# Altium footprint library ICs And Semiconductors SMD.PcbLib: 943 footprints (part 21 of 60)
Each footprint in its own frame and in the unit in brackets; x right, y up, seen from the top. Pads: shape width x height; smd on the part's side, far side on the other; paste and mask are expansions set on the pad; w line width, h text height; cw(c..) or ccw(c..) is an arc to the next point about the centre after c.
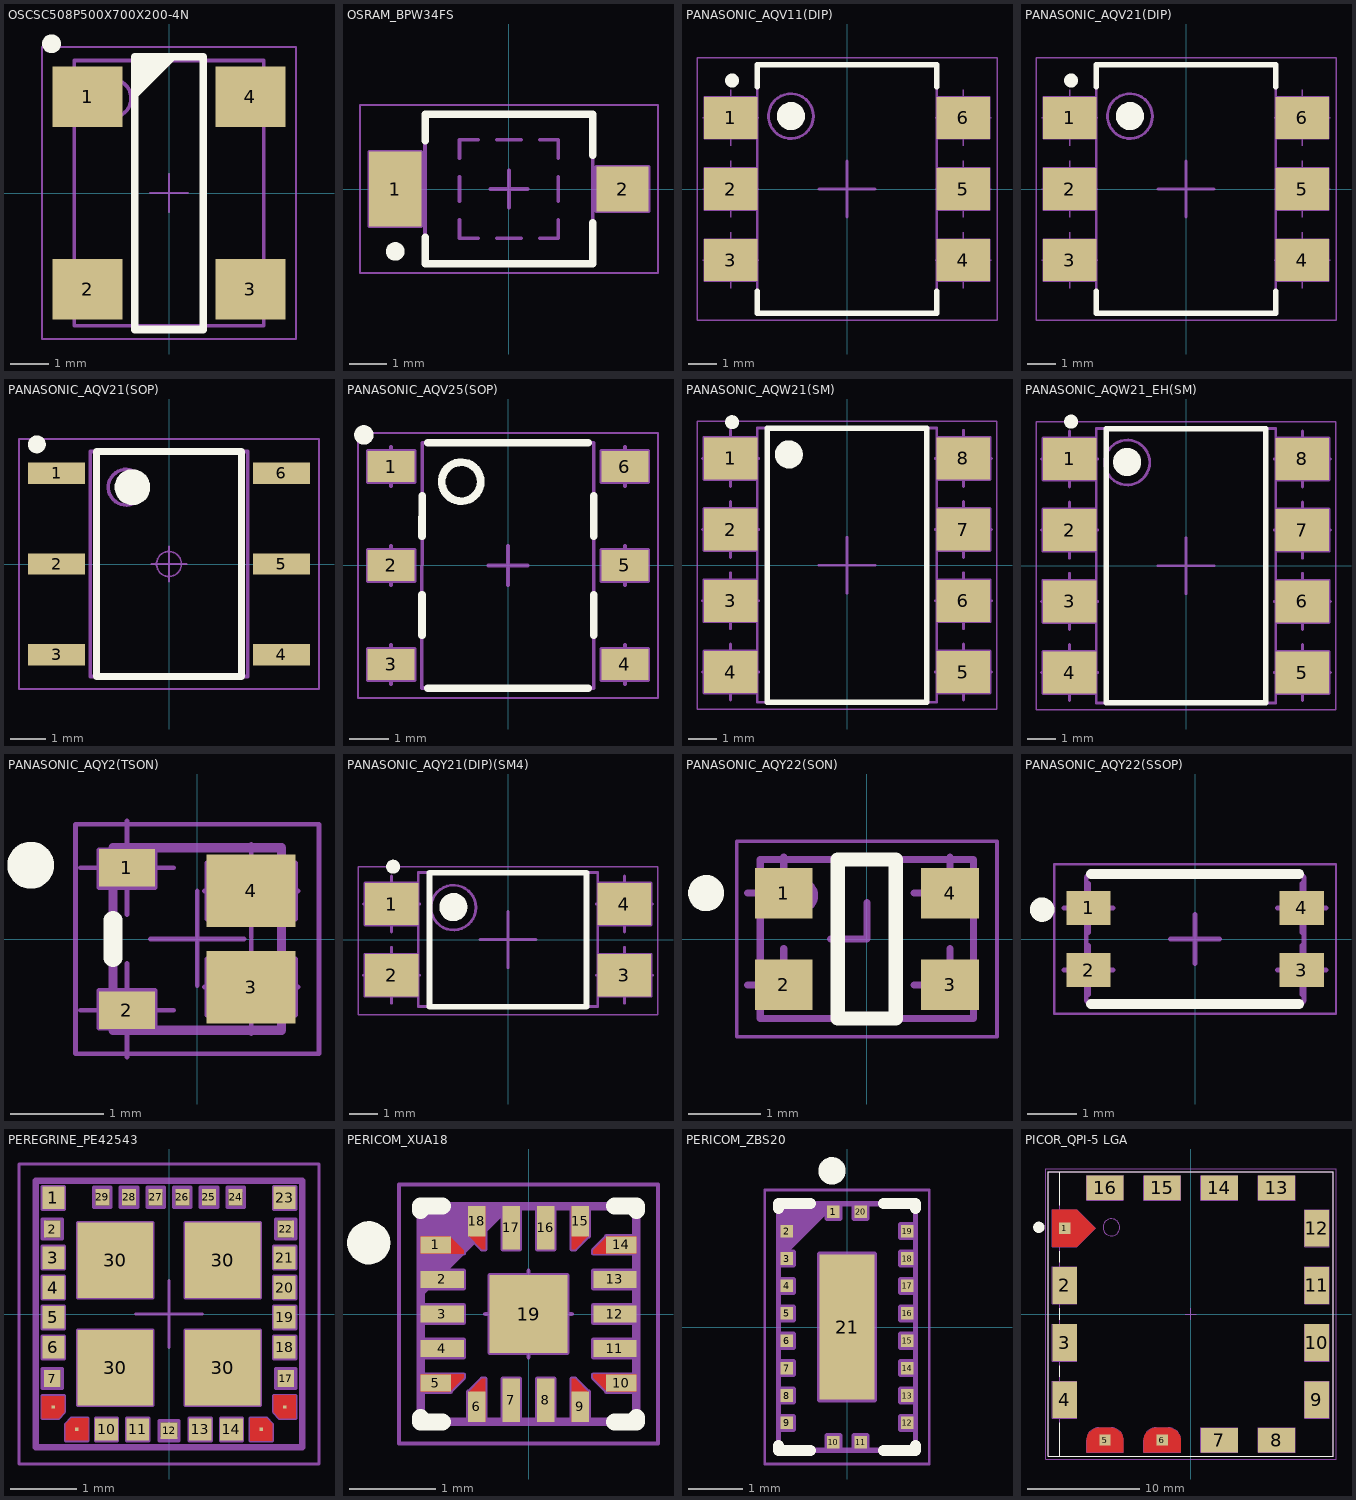
[diagram p20: the footprints below, top view; thin cyan lines are the x and y axes]

## OSCSC508P500X700X200-4N [mm] "CFPT Case, SMD Oscillator, side convave, 4 pins, 5.00x7.00mm"
height 2
pads (4):
  rect 1.85x1.6 smd: 1(-2.15,2.54) 2(-2.15,-2.54) 3(2.15,-2.54) 4(2.15,2.54)
Top Overlay:
  circle w0.25: c-3.1,3.94 r0.125
  lines w0.2: -0.9,2.6 0.1,3.6 ; -0.9,2.8 -0.1,3.6 ; -0.9,3 -0.3,3.6 ; -0.9,3.2 -0.5,3.6 ; -0.9,3.4 -0.7,3.6 ; -0.9,-3.6 -0.9,3.6 0.9,3.6 0.9,-3.6 -0.9,-3.6
Mechanical 14:
  circle w0.1: c-1.5,2.5 r0.5
  lines w0.1: -2.5,-3.5 2.5,-3.5 2.5,3.5 -2.5,3.5 -2.5,-3.5
Mechanical 15:
  lines w0.05: -0.5,0 0.5,0 ; 0,-0.5 0,0.5 ; -3.35,-3.85 3.35,-3.85 3.35,3.85 -3.35,3.85 -3.35,-3.85
3D body "OSCSC508P500X700X200-4N.stp": height 2, standoff 0, extent -2.6,-3.6 2.6,3.6

## OSRAM_BPW34FS [mm] "SMT Silicon PIN Photodiode, Photosensitive Area 2.65 x 2.65 mm, with Daylight Filter"
height 1.2
pads (2):
  rect 1.4x2 smd: 1(-3.05,0)
  rect 1.4x1.2 smd: 2(3.05,0)
Top Overlay:
  circle w0.25: c-3.05,-1.675 r0.125
  lines w0.2: -2.25,-1.3 -2.25,-2 2.25,-2 2.25,-0.9 ; -2.25,1.3 -2.25,2 2.25,2 2.25,0.9
Mechanical 8:
  lines w0.1: -3.55,0 -3.05,0 ; -3.05,-0.5 -3.05,0 ; -3.05,0.5 -3.05,0 ; -2.55,0 -3.05,0 ; -0.5,0 0,0 ; 0,-0.5 0,0 ; 0,0.5 0,0 ; 0.5,0 0,0 ; 2.55,0 3.05,0 ; 3.05,-0.5 3.05,0 ; 3.05,0.5 3.05,0 ; 3.55,0 3.05,0 ; -3.75,-1 -2.35,-1 -2.35,1 -3.75,1 -3.75,-1 ; 2.35,-0.6 3.75,-0.6 3.75,0.6 2.35,0.6 2.35,-0.6
Mechanical 14:
  lines w0.1: -2.25,-0.85 -3.35,-0.85 -3.35,0.85 -2.25,0.85 ; -2.25,-0.45 -2.656,-0.45 -2.656,0.45 -2.25,0.45 ; -1.325,-0.825 -1.325,-1.325 -0.825,-1.325 ; -1.325,-0.325 -1.325,0.325 ; -1.325,0.825 -1.325,1.325 -0.825,1.325 ; -0.325,-1.325 0.325,-1.325 ; -0.325,1.325 0.325,1.325 ; 0.825,-1.325 1.325,-1.325 1.325,-0.825 ; 0.825,1.325 1.325,1.325 1.325,0.825 ; 1.325,-0.325 1.325,0.325 ; 2.25,-0.45 3.35,-0.45 3.35,0.45 2.25,0.45 ; -2.25,-2 -2.25,2 2.25,2 2.25,-2 -2.25,-2
Mechanical 15:
  lines w0.05: -4,-2.25 -4,2.25 4,2.25 4,-2.25 -4,-2.25
3D body "OSRAM_BPW34FS.stp": height 1.2, standoff 0, extent -3.35,-2 3.35,2

## PANASONIC_AQV11(DIP) [mm] "PANASONIC_AQV11(DIP) 2.54mm pitch; 6 pin, 6.45mm W X 8.85mm L X 3.40mm H body"
height 3.4
pads (6):
  rect 1.9x1.5 smd: 1(-4.15,2.54) 2(-4.15,0) 3(-4.15,-2.54) 4(4.15,-2.54) 5(4.15,0) 6(4.15,2.54)
Top Overlay:
  circle w0.5: c-2,2.6 r0.25
  circle w0.25: c-4.1,3.87 r0.125
  lines w0.2: -3.2,-3.64 -3.2,-4.425 3.2,-4.425 3.2,-3.64 ; -3.2,3.64 -3.2,4.425 3.2,4.425 3.2,3.64
Mechanical 8:
  lines w0.05: -5.15,-2.54 -4.15,-2.54 ; -5.15,0 -4.15,0 ; -5.15,2.54 -4.15,2.54 ; -4.15,-3.54 -4.15,-2.54 ; -4.15,-1.54 -4.15,-2.54 ; -4.15,-1 -4.15,0 ; -4.15,1 -4.15,0 ; -4.15,1.54 -4.15,2.54 ; -4.15,3.54 -4.15,2.54 ; -3.15,-2.54 -4.15,-2.54 ; -3.15,0 -4.15,0 ; -3.15,2.54 -4.15,2.54 ; 3.15,-2.54 4.15,-2.54 ; 3.15,0 4.15,0 ; 3.15,2.54 4.15,2.54 ; 4.15,-3.54 4.15,-2.54 ; 4.15,-1.54 4.15,-2.54 ; 4.15,-1 4.15,0 ; 4.15,1 4.15,0 ; 4.15,1.54 4.15,2.54 ; 4.15,3.54 4.15,2.54 ; 5.15,-2.54 4.15,-2.54 ; 5.15,0 4.15,0 ; 5.15,2.54 4.15,2.54 ; -5.1,-3.29 -5.1,-1.79 -3.2,-1.79 -3.2,-3.29 -5.1,-3.29 ; -5.1,-0.75 -5.1,0.75 -3.2,0.75 -3.2,-0.75 -5.1,-0.75 ; -5.1,1.79 -5.1,3.29 -3.2,3.29 -3.2,1.79 -5.1,1.79 ; 3.2,-3.29 3.2,-1.79 5.1,-1.79 5.1,-3.29 3.2,-3.29 ; 3.2,-0.75 3.2,0.75 5.1,0.75 5.1,-0.75 3.2,-0.75 ; 3.2,1.79 3.2,3.29 5.1,3.29 5.1,1.79 3.2,1.79
  lines w0.1: -1,0 0,0 ; 0,-1 0,0 ; 0,1 0,0 ; 1,0 0,0
Mechanical 14:
  circle w0.1: c-2,2.6 r0.8
  lines w0.1: -3.2,-4.425 -3.2,4.425 3.2,4.425 3.2,-4.425 -3.2,-4.425
Mechanical 15:
  lines w0.05: -5.35,-4.675 -5.35,4.675 5.35,4.675 5.35,-4.675 -5.35,-4.675
3D body "PANASONIC_AQV21(DIP).stp": height 3.4, standoff 0, extent -4.81,-4.425 4.81,4.425

## PANASONIC_AQV21(DIP) [mm] "PANASONIC_AQV21(DIP) 2.54mm pitch; 6 pin, 6.45mm W X 8.85mm L X 3.40mm H body"
height 3.4
pads (6):
  rect 1.9x1.5 smd: 1(-4.15,2.54) 2(-4.15,0) 3(-4.15,-2.54) 4(4.15,-2.54) 5(4.15,0) 6(4.15,2.54)
Top Overlay:
  circle w0.25: c-4.1,3.87 r0.125
  circle w0.5: c-2,2.6 r0.25
  lines w0.2: -3.2,-3.64 -3.2,-4.425 3.2,-4.425 3.2,-3.64 ; -3.2,3.64 -3.2,4.425 3.2,4.425 3.2,3.64
Mechanical 8:
  lines w0.05: -5.15,-2.54 -4.15,-2.54 ; -5.15,0 -4.15,0 ; -5.15,2.54 -4.15,2.54 ; -4.15,-3.54 -4.15,-2.54 ; -4.15,-1.54 -4.15,-2.54 ; -4.15,-1 -4.15,0 ; -4.15,1 -4.15,0 ; -4.15,1.54 -4.15,2.54 ; -4.15,3.54 -4.15,2.54 ; -3.15,-2.54 -4.15,-2.54 ; -3.15,0 -4.15,0 ; -3.15,2.54 -4.15,2.54 ; 3.15,-2.54 4.15,-2.54 ; 3.15,0 4.15,0 ; 3.15,2.54 4.15,2.54 ; 4.15,-3.54 4.15,-2.54 ; 4.15,-1.54 4.15,-2.54 ; 4.15,-1 4.15,0 ; 4.15,1 4.15,0 ; 4.15,1.54 4.15,2.54 ; 4.15,3.54 4.15,2.54 ; 5.15,-2.54 4.15,-2.54 ; 5.15,0 4.15,0 ; 5.15,2.54 4.15,2.54 ; -5.1,-3.29 -3.2,-3.29 -3.2,-1.79 -5.1,-1.79 -5.1,-3.29 ; -5.1,-0.75 -3.2,-0.75 -3.2,0.75 -5.1,0.75 -5.1,-0.75 ; -5.1,1.79 -3.2,1.79 -3.2,3.29 -5.1,3.29 -5.1,1.79 ; 3.2,-3.29 5.1,-3.29 5.1,-1.79 3.2,-1.79 3.2,-3.29 ; 3.2,-0.75 5.1,-0.75 5.1,0.75 3.2,0.75 3.2,-0.75 ; 3.2,1.79 5.1,1.79 5.1,3.29 3.2,3.29 3.2,1.79
  lines w0.1: -1,0 0,0 ; 0,-1 0,0 ; 0,1 0,0 ; 1,0 0,0
Mechanical 14:
  circle w0.1: c-2,2.6 r0.8
  lines w0.1: -3.2,-4.425 3.2,-4.425 3.2,4.425 -3.2,4.425 -3.2,-4.425
Mechanical 15:
  lines w0.05: -5.35,-4.675 5.35,-4.675 5.35,4.675 -5.35,4.675 -5.35,-4.675
3D body "PANASONIC_AQV21(DIP).stp": height 3.4, standoff 0, extent -4.81,-4.425 4.81,4.425

## PANASONIC_AQV21(SOP) [mm] "PANASONIC_AQV21(SOP) 2.54mm pitch; 6 pin, 4.40mm W X 6.30mm L X 2.20mm H body"
height 2.2
pads (6):
  rect 1.6x0.6 smd: 1(-3.15,2.54) 2(-3.15,0) 3(-3.15,-2.54) 4(3.15,-2.54) 5(3.15,0) 6(3.15,2.54)
Top Overlay:
  circle w0.25: c-3.7,3.35 r0.125
  circle w0.5: c-1.025,2.15 r0.25
  lines w0.2: -2.025,-3.15 -2.025,3.15 2.025,3.15 2.025,-3.15 -2.025,-3.15
Mechanical 14:
  circle w0.1: c-1.2,2.15 r0.5
  lines w0.1: -2.2,-3.15 -2.2,3.15 2.2,3.15 2.2,-3.15 -2.2,-3.15
Mechanical 15:
  circle w0.05: c0,0 r0.35
  lines w0.05: -0.5,0 0.5,0 ; 0,-0.5 0,0.5 ; -4.2,-3.5 -4.2,3.5 4.2,3.5 4.2,-3.5 -4.2,-3.5
3D body "PANASONIC_AQV21(SOP).stp": height 2.2, standoff 0, extent -3.6,-3.25 3.6,3.25

## PANASONIC_AQV25(SOP) [mm] "PANASONIC_AQV25(SOP) 2.54mm pitch; 6 pin, 4.40mm W X 6.30mm L X 2.20mm H body"
height 2.2
pads (6):
  rect 1.2x0.8 smd: 1(-3,2.54) 2(-3,0) 3(-3,-2.54) 4(3,-2.54) 5(3,0) 6(3,2.54)
Top Overlay:
  circle w0.2: c-1.2,2.15 r0.5
  circle w0.25: c-3.7,3.35 r0.125
  lines w0.2: -2.21,-1.79 -2.208,-0.75 ; -2.205,0.75 -2.203,1.79 ; -2.05,-3.15 2.05,-3.15 ; -2.05,3.15 2.05,3.15 ; 2.2,-1.79 2.2,-0.75 ; 2.2,0.75 2.2,1.79
Mechanical 8:
  lines w0.1: -3.5,-2.54 -3,-2.54 ; -3.5,0 -3,0 ; -3.5,2.54 -3,2.54 ; -3,-3.04 -3,-2.54 ; -3,-2.04 -3,-2.54 ; -3,-0.5 -3,0 ; -3,0.5 -3,0 ; -3,2.04 -3,2.54 ; -3,3.04 -3,2.54 ; -2.5,-2.54 -3,-2.54 ; -2.5,0 -3,0 ; -2.5,2.54 -3,2.54 ; -0.5,0 0,0 ; 0,-0.5 0,0 ; 0,0.5 0,0 ; 0.5,0 0,0 ; 2.5,-2.54 3,-2.54 ; 2.5,0 3,0 ; 2.5,2.54 3,2.54 ; 3,-3.04 3,-2.54 ; 3,-2.04 3,-2.54 ; 3,-0.5 3,0 ; 3,0.5 3,0 ; 3,2.04 3,2.54 ; 3,3.04 3,2.54 ; 3.5,-2.54 3,-2.54 ; 3.5,0 3,0 ; 3.5,2.54 3,2.54 ; -3.6,-2.94 -3.6,-2.14 -2.4,-2.14 -2.4,-2.94 -3.6,-2.94 ; -3.6,-0.4 -3.6,0.4 -2.4,0.4 -2.4,-0.4 -3.6,-0.4 ; -3.6,2.14 -3.6,2.94 -2.4,2.94 -2.4,2.14 -3.6,2.14 ; 2.4,-2.94 2.4,-2.14 3.6,-2.14 3.6,-2.94 2.4,-2.94 ; 2.4,-0.4 2.4,0.4 3.6,0.4 3.6,-0.4 2.4,-0.4 ; 2.4,2.14 2.4,2.94 3.6,2.94 3.6,2.14 2.4,2.14
Mechanical 14:
  circle w0.1: c-1.2,2.15 r0.5
  lines w0.1: -2.213,-3.15 2.2,-3.15 2.2,3.15 -2.2,3.15 -2.213,-3.15
Mechanical 15:
  lines w0.05: -3.85,-3.4 3.85,-3.4 3.85,3.4 -3.85,3.4 -3.85,-3.4
3D body "PANASONIC_AQV25(SOP).stp": height 2.1, standoff 0, extent -3.371,-3.15 3.371,3.15

## PANASONIC_AQW21(SM) [mm] "PANASONIC AQW21, Gull Wing Surface Mount, 8-Leads, Body 9.78mm x 6.4mm, Pitch 2.54mm"
height 3.4
pads (8):
  rect 1.9x1.5 smd: 1(-4.15,3.81) 2(-4.15,1.27) 3(-4.15,-1.27) 4(-4.15,-3.81) 5(4.15,-3.81) 6(4.15,-1.27) 7(4.15,1.27) 8(4.15,3.81)
Top Overlay:
  circle w0.25: c-4.1,5.1 r0.125
  circle w0.5: c-2.075,3.95 r0.25
  lines w0.2: -2.85,-4.89 2.85,-4.89 2.85,4.89 -2.85,4.89 -2.85,-4.89
Mechanical 8:
  lines w0.1: -5.15,-3.81 -4.15,-3.81 ; -5.15,-1.27 -4.15,-1.27 ; -5.15,1.27 -4.15,1.27 ; -5.15,3.81 -4.15,3.81 ; -4.15,-4.81 -4.15,-3.81 ; -4.15,-2.81 -4.15,-3.81 ; -4.15,-2.27 -4.15,-1.27 ; -4.15,-0.27 -4.15,-1.27 ; -4.15,0.27 -4.15,1.27 ; -4.15,2.27 -4.15,1.27 ; -4.15,2.81 -4.15,3.81 ; -4.15,4.81 -4.15,3.81 ; -3.15,-3.81 -4.15,-3.81 ; -3.15,-1.27 -4.15,-1.27 ; -3.15,1.27 -4.15,1.27 ; -3.15,3.81 -4.15,3.81 ; -1,0 0,0 ; 0,-1 0,0 ; 0,1 0,0 ; 1,0 0,0 ; 3.15,-3.81 4.15,-3.81 ; 3.15,-1.27 4.15,-1.27 ; 3.15,1.27 4.15,1.27 ; 3.15,3.81 4.15,3.81 ; 4.15,-4.81 4.15,-3.81 ; 4.15,-2.81 4.15,-3.81 ; 4.15,-2.27 4.15,-1.27 ; 4.15,-0.27 4.15,-1.27 ; 4.15,0.27 4.15,1.27 ; 4.15,2.27 4.15,1.27 ; 4.15,2.81 4.15,3.81 ; 4.15,4.81 4.15,3.81 ; 5.15,-3.81 4.15,-3.81 ; 5.15,-1.27 4.15,-1.27 ; 5.15,1.27 4.15,1.27 ; 5.15,3.81 4.15,3.81 ; -5.1,-4.56 -3.2,-4.56 -3.2,-3.06 -5.1,-3.06 -5.1,-4.56 ; -5.1,-2.02 -3.2,-2.02 -3.2,-0.52 -5.1,-0.52 -5.1,-2.02 ; -5.1,0.52 -3.2,0.52 -3.2,2.02 -5.1,2.02 -5.1,0.52 ; -5.1,3.06 -3.2,3.06 -3.2,4.56 -5.1,4.56 -5.1,3.06 ; 3.2,-4.56 5.1,-4.56 5.1,-3.06 3.2,-3.06 3.2,-4.56 ; 3.2,-2.02 5.1,-2.02 5.1,-0.52 3.2,-0.52 3.2,-2.02 ; 3.2,0.52 5.1,0.52 5.1,2.02 3.2,2.02 3.2,0.52 ; 3.2,3.06 5.1,3.06 5.1,4.56 3.2,4.56 3.2,3.06
Mechanical 14:
  lines w0.1: -3.2,-4.89 3.2,-4.89 3.2,4.89 -3.2,4.89 -3.2,-4.89
Mechanical 15:
  lines w0.05: -5.35,-5.14 -5.35,5.14 5.35,5.14 5.35,-5.14 -5.35,-5.14
3D body "PANASONIC_AQW21(DIP).stp": height 3.4, standoff 0, extent -4.81,-4.89 4.81,4.89

## PANASONIC_AQW21_EH(SM) [mm] "PANASONIC AQW21 Gull Wing Surface Mount, 8-Leads, Body 9.86mm x 6.4mm, Pitch 2.54mm"
height 2.95
pads (8):
  rect 1.9x1.5 smd: 1(-4.15,3.81) 2(-4.15,1.27) 3(-4.15,-1.27) 4(-4.15,-3.81) 5(4.15,-3.81) 6(4.15,-1.27) 7(4.15,1.27) 8(4.15,3.81)
Top Overlay:
  circle w0.25: c-4.1,5.14 r0.125
  circle w0.5: c-2.1,3.7 r0.25
  lines w0.2: -2.85,-4.89 2.85,-4.89 2.85,4.89 -2.85,4.89 -2.85,-4.89
Mechanical 8:
  lines w0.1: -5.15,-3.81 -4.15,-3.81 ; -5.15,-1.27 -4.15,-1.27 ; -5.15,1.27 -4.15,1.27 ; -5.15,3.81 -4.15,3.81 ; -4.15,-4.81 -4.15,-3.81 ; -4.15,-2.81 -4.15,-3.81 ; -4.15,-2.27 -4.15,-1.27 ; -4.15,-0.27 -4.15,-1.27 ; -4.15,0.27 -4.15,1.27 ; -4.15,2.27 -4.15,1.27 ; -4.15,2.81 -4.15,3.81 ; -4.15,4.81 -4.15,3.81 ; -3.15,-3.81 -4.15,-3.81 ; -3.15,-1.27 -4.15,-1.27 ; -3.15,1.27 -4.15,1.27 ; -3.15,3.81 -4.15,3.81 ; -1,0 0,0 ; 0,-1 0,0 ; 0,1 0,0 ; 1,0 0,0 ; 3.15,-3.81 4.15,-3.81 ; 3.15,-1.27 4.15,-1.27 ; 3.15,1.27 4.15,1.27 ; 3.15,3.81 4.15,3.81 ; 4.15,-4.81 4.15,-3.81 ; 4.15,-2.81 4.15,-3.81 ; 4.15,-2.27 4.15,-1.27 ; 4.15,-0.27 4.15,-1.27 ; 4.15,0.27 4.15,1.27 ; 4.15,2.27 4.15,1.27 ; 4.15,2.81 4.15,3.81 ; 4.15,4.81 4.15,3.81 ; 5.15,-3.81 4.15,-3.81 ; 5.15,-1.27 4.15,-1.27 ; 5.15,1.27 4.15,1.27 ; 5.15,3.81 4.15,3.81 ; -5.1,-4.56 -3.2,-4.56 -3.2,-3.06 -5.1,-3.06 -5.1,-4.56 ; -5.1,-2.02 -3.2,-2.02 -3.2,-0.52 -5.1,-0.52 -5.1,-2.02 ; -5.1,0.52 -3.2,0.52 -3.2,2.02 -5.1,2.02 -5.1,0.52 ; -5.1,3.06 -3.2,3.06 -3.2,4.56 -5.1,4.56 -5.1,3.06 ; 3.2,-4.56 5.1,-4.56 5.1,-3.06 3.2,-3.06 3.2,-4.56 ; 3.2,-2.02 5.1,-2.02 5.1,-0.52 3.2,-0.52 3.2,-2.02 ; 3.2,0.52 5.1,0.52 5.1,2.02 3.2,2.02 3.2,0.52 ; 3.2,3.06 5.1,3.06 5.1,4.56 3.2,4.56 3.2,3.06
Mechanical 14:
  circle w0.1: c-2.095,3.683 r0.8
  lines w0.1: -3.2,-4.89 3.2,-4.89 3.2,4.89 -3.2,4.89 -3.2,-4.89
Mechanical 15:
  lines w0.05: -5.35,-5.14 -5.35,5.14 5.35,5.14 5.35,-5.14 -5.35,-5.14
3D body "PANASONIC_AQW21_EH(SM).stp": height 2.95, standoff 0, extent -4.81,-4.89 4.81,4.89

## PANASONIC_AQY2(TSON) [mm] "PANASONIC Serie AQY2, TSON Super Miniature Outline No Lead, 4 pins, 1.95x1.8mm"
height 0.8
pads (4):
  rect 0.6x0.4 smd: 1(-0.75,0.76) 2(-0.75,-0.76)
  rect 0.95x0.775 smd: 3(0.575,-0.513) 4(0.575,0.513)
Top Overlay:
  circle w0.25: c-1.778,0.787 r0.125
  lines w0.2: -0.9,-0.2 -0.9,0.2
Mechanical 8:
  lines w0.05: -1.25,-0.76 -0.75,-0.76 ; -1.25,0.76 -0.75,0.76 ; -0.75,-1.26 -0.75,-0.76 ; -0.75,-0.26 -0.75,-0.76 ; -0.75,0.26 -0.75,0.76 ; -0.75,1.26 -0.75,0.76 ; -0.5,0 0,0 ; -0.25,-0.76 -0.75,-0.76 ; -0.25,0.76 -0.75,0.76 ; 0,-0.5 0,0 ; 0,0.513 0,0 ; 0.075,-0.513 0.575,-0.513 ; 0.075,0.513 0.575,0.513 ; 0.5,0 0,0 ; 0.575,-1.013 0.575,-0.513 ; 0.575,-0.013 0.575,-0.513 ; 0.575,0.013 0.575,0.513 ; 0.575,1.013 0.575,0.513 ; 1.075,-0.513 0.575,-0.513 ; 1.075,0.513 0.575,0.513 ; -1.05,-0.95 -1.05,-0.55 -0.45,-0.55 -0.45,-0.95 -1.05,-0.95 ; -1.05,0.55 -0.45,0.55 -0.45,0.95 -1.05,0.95 -1.05,0.55 ; 0.1,-0.813 1.05,-0.813 1.05,-0.213 0.1,-0.213 0.1,-0.813 ; 0.1,0.213 0.1,0.813 1.05,0.813 1.05,0.213 0.1,0.213
Mechanical 14:
  lines w0.1: -0.9,-0.975 0.9,-0.975 0.9,0.975 -0.9,0.975 -0.9,-0.975
Mechanical 15:
  lines w0.05: -1.3,-1.225 1.3,-1.225 1.3,1.225 -1.3,1.225 -1.3,-1.225
3D body "PANASONIC_AQY2(TSON).stp": height 0.8, standoff 0, extent -0.9,-0.975 0.9,0.975

## PANASONIC_AQY21(DIP)(SM4) [mm] "PANASONIC AQY21, Gull Wing Surface Mount, 4-Leads, Body 4.78mm x 6.4mm, Pitch 2.54mm"
height 2.75
pads (4):
  rect 1.9x1.5 smd: 1(-4.15,1.27) 2(-4.15,-1.27) 3(4.15,-1.27) 4(4.15,1.27)
Top Overlay:
  circle w0.25: c-4.1,2.6 r0.125
  circle w0.5: c-1.95,1.16 r0.25
  lines w0.2: -2.8,-2.39 2.8,-2.39 2.8,2.39 -2.8,2.39 -2.8,-2.39
Mechanical 8:
  lines w0.1: -5.15,-1.27 -4.15,-1.27 ; -5.15,1.27 -4.15,1.27 ; -4.15,-2.27 -4.15,-1.27 ; -4.15,-0.27 -4.15,-1.27 ; -4.15,0.27 -4.15,1.27 ; -4.15,2.27 -4.15,1.27 ; -3.15,-1.27 -4.15,-1.27 ; -3.15,1.27 -4.15,1.27 ; -1,0 0,0 ; 0,-1 0,0 ; 0,1 0,0 ; 1,0 0,0 ; 3.15,-1.27 4.15,-1.27 ; 3.15,1.27 4.15,1.27 ; 4.15,-2.27 4.15,-1.27 ; 4.15,-0.27 4.15,-1.27 ; 4.15,0.27 4.15,1.27 ; 4.15,2.27 4.15,1.27 ; 5.15,-1.27 4.15,-1.27 ; 5.15,1.27 4.15,1.27 ; -5.1,-2.02 -3.2,-2.02 -3.2,-0.52 -5.1,-0.52 -5.1,-2.02 ; -5.1,0.52 -3.2,0.52 -3.2,2.02 -5.1,2.02 -5.1,0.52 ; 3.2,-2.02 5.1,-2.02 5.1,-0.52 3.2,-0.52 3.2,-2.02 ; 3.2,0.52 5.1,0.52 5.1,2.02 3.2,2.02 3.2,0.52
Mechanical 14:
  circle w0.1: c-1.945,1.143 r0.8
  lines w0.1: -3.2,-2.39 3.2,-2.39 3.2,2.39 -3.2,2.39 -3.2,-2.39
Mechanical 15:
  lines w0.05: -5.35,-2.68 5.35,-2.68 5.35,2.6 -5.35,2.6 -5.35,-2.68
3D body "PANASONIC_AQY21(DIP)(SM4).stp": height 2.75, standoff 0, extent -4.81,-2.415 4.81,2.415

## PANASONIC_AQY22(SON) [mm] "PANASONIC Serie AQY22(SON)  Small Outline No Lead, 4 pins, 2.2x2.95mm"
height 1.4
pads (4):
  rect 0.8x0.7 smd: 1(-1.15,0.635) 2(-1.15,-0.635) 3(1.15,-0.635) 4(1.15,0.635)
Top Overlay:
  circle w0.25: c-2.225,0.635 r0.125
  lines w0.2: -0.4,-1.1 0.4,-1.1 0.4,1.1 -0.4,1.1 -0.4,-1.1
Mechanical 8:
  lines w0.1: -1.65,-0.635 -1.15,-0.635 -1.15,-0.135 ; -1.65,0.635 -1.15,0.635 -1.15,1.135 ; -0.5,0 0,0 0,0.5 ; 0.65,-0.635 1.15,-0.635 1.15,-0.135 ; 0.65,0.635 1.15,0.635 1.15,1.135
Mechanical 14:
  circle w0.1: c-0.925,0.6 r0.2
  lines w0.1: -1.475,-1.1 1.475,-1.1 1.475,1.1 -1.475,1.1 -1.475,-1.1
Mechanical 15:
  lines w0.05: -1.8,-1.35 1.8,-1.35 1.8,1.35 -1.8,1.35 -1.8,-1.35
3D body "PANASONIC_AQY22(SON).stp": height 1.4, standoff 0, extent -1.475,-1.1 1.475,1.1

## PANASONIC_AQY22(SSOP) [mm] "PANASONIC Serie AQY22(SSOP) Flat Leads SSOP  4 pins, 4.45x2.65mm"
height 1.8
pads (4):
  rect 0.9x0.7 smd: 1(-2.175,0.635) 2(-2.175,-0.635) 3(2.175,-0.635) 4(2.175,0.635)
Top Overlay:
  circle w0.25: c-3.125,0.6 r0.125
  lines w0.2: -2.125,-1.325 2.125,-1.325 ; -2.125,1.325 2.125,1.325
Mechanical 8:
  lines w0.1: -2.675,-0.635 -2.175,-0.635 ; -2.675,0.635 -2.175,0.635 ; -2.175,-1.135 -2.175,-0.635 ; -2.175,-0.135 -2.175,-0.635 ; -2.175,0.135 -2.175,0.635 ; -2.175,1.135 -2.175,0.635 ; -1.675,-0.635 -2.175,-0.635 ; -1.675,0.635 -2.175,0.635 ; -0.5,0 0,0 ; 0,-0.5 0,0 ; 0,0.5 0,0 ; 0.5,0 0,0 ; 1.675,-0.635 2.175,-0.635 ; 1.675,0.635 2.175,0.635 ; 2.175,-1.135 2.175,-0.635 ; 2.175,-0.135 2.175,-0.635 ; 2.175,0.135 2.175,0.635 ; 2.175,1.135 2.175,0.635 ; 2.675,-0.635 2.175,-0.635 ; 2.675,0.635 2.175,0.635
Mechanical 14:
  lines w0.1: -2.225,-0.835 -2.425,-0.835 -2.425,-0.435 -2.225,-0.435 ; -2.225,0.435 -2.425,0.435 -2.425,0.835 -2.225,0.835 ; 2.225,-0.835 2.425,-0.835 2.425,-0.435 2.225,-0.435 ; 2.225,0.435 2.425,0.435 2.425,0.835 2.225,0.835 ; -2.225,-1.225 ccw(c-2.125,-1.225) -2.125,-1.325 2.125,-1.325 ccw(c2.125,-1.225) 2.225,-1.225 2.225,1.225 ccw(c2.125,1.225) 2.125,1.325 -2.125,1.325 ccw(c-2.125,1.225) -2.225,1.225 -2.225,-1.225
Mechanical 15:
  lines w0.05: -2.875,-1.525 2.875,-1.525 2.875,1.525 -2.875,1.525 -2.875,-1.525
3D body "PANASONIC_AQY22(SSOP).stp": height 1.8, standoff 0, extent -2.425,-1.325 2.425,1.325

## PEREGRINE_PE42543 [mm] "LGA, 0.40mm pitch, 29 Pin, 4.00mm L X 4.00mm W X 1.00mm H body"
height 1
pads (33):
  rect 0.33x0.34 smd: 1(-1.735,1.743) 3(-1.735,0.846) 4(-1.735,0.397) 5(-1.735,-0.051) 6(-1.735,-0.499) 18(1.735,-0.499) 19(1.735,-0.051) 20(1.735,0.397) 21(1.735,0.846) 23(1.735,1.743)
  rect 0.25x0.25 smd: 2(-1.75,1.274) 7(-1.75,-0.968) 12(0,-1.75) 17(1.75,-0.968) 22(1.75,1.274)
  rect 0.05x0.05 smd: 8(-1.735,-1.396) 9(-1.385,-1.73) 15(1.385,-1.73) 16(1.735,-1.396)
  rect 0.34x0.33 smd: 10(-0.937,-1.73) 11(-0.468,-1.73) 13(0.468,-1.73) 14(0.937,-1.73)
  rect 0.21x0.25 smd: 24(1,1.75) 25(0.6,1.75) 26(0.2,1.75) 27(-0.2,1.75) 28(-0.6,1.75) 29(-1,1.75)
  rect 1.13x1.13 smd: 30(-0.805,-0.805) 30(-0.805,0.805) 30(0.805,-0.805) 30(0.805,0.805)
Top Layer:
  region: 1.57,-1.476 1.655,-1.561 1.9,-1.561 1.9,-1.221 1.57,-1.221
  region: 1.55,-1.65 1.465,-1.565 1.22,-1.565 1.22,-1.905 1.55,-1.905
  region: -1.465,-1.565 -1.55,-1.65 -1.55,-1.895 -1.21,-1.895 -1.21,-1.565
  region: -1.655,-1.561 -1.57,-1.476 -1.57,-1.231 -1.91,-1.231 -1.91,-1.561
Mechanical 8:
  drawing of 214 lines, arcs and shapes, not listed
Mechanical 14:
  lines w0.1: -2,-2 -2,2 2,2 2,-2 -2,-2
Mechanical 15:
  lines w0.05: -2.25,-2.25 -2.25,2.25 2.25,2.25 2.25,-2.25 -2.25,-2.25
3D body "PEREGRINE_PE42543.stp": height 1, standoff 0, extent -2,-2 2,2

## PERICOM_XUA18 [mm] "PERICOM X2QFN Code XUA18, 0.40mm Pitch, Rect.; 18 Pin, 2mm L X 2mm W X 0.4mm H Body (W/Thermal Tab 0.9mm X 0.9mm)"
height 0.4
pads (19):
  rect 0.35x0.2 smd: 1(-1.075,0.8) 5(-1.075,-0.8) 10(1.075,-0.8) 14(1.075,0.8)
  rect 0.5x0.2 smd: 2(-1,0.4) 3(-1,0) 4(-1,-0.4) 11(1,-0.4) 12(1,0) 13(1,0.4)
  rect 0.2x0.35 smd: 6(-0.6,-1.075) 9(0.6,-1.075) 15(0.6,1.075) 18(-0.6,1.075)
  rect 0.2x0.5 smd: 7(-0.2,-1) 8(0.2,-1) 16(0.2,1) 17(-0.2,1)
  rect 0.9x0.9 smd: 19(0,0)
Top Layer:
  region: -1.25,-0.9 -1.25,-0.7 -0.75,-0.7 -0.75,-0.74 -0.91,-0.9
  region: -0.7,-1.25 -0.5,-1.25 -0.5,-0.75 -0.54,-0.75 -0.7,-0.91
  region: 0.5,-1.25 0.7,-1.25 0.7,-0.91 0.54,-0.75 0.5,-0.75
  region: 0.75,-0.74 0.91,-0.9 1.25,-0.9 1.25,-0.7 0.75,-0.7
  region: 0.75,0.7 0.75,0.74 0.91,0.9 1.25,0.9 1.25,0.7
  region: 0.5,0.75 0.54,0.75 0.7,0.91 0.7,1.25 0.5,1.25
  region: -0.7,0.91 -0.7,1.25 -0.5,1.25 -0.5,0.75 -0.54,0.75
  region: -1.25,0.7 -0.75,0.7 -0.75,0.74 -0.91,0.9 -1.25,0.9
Top Overlay:
  circle w0.25: c-1.85,0.825 r0.125
  lines w0.2: -1.25,-1.2 -1.25,-1.25 -1,-1.25 ; -1.25,1.2 -1.25,1.25 -1,1.25 ; 1,-1.25 1.25,-1.25 1.25,-1.2 ; 1,1.25 1.25,1.25 1.25,1.2
Mechanical 8:
  drawing of 156 lines, arcs and shapes, not listed
Mechanical 14:
  lines w0.1: -1.25,0.25 -0.25,1.25 ; -1.25,0.35 -0.35,1.25 ; -1.25,0.45 -0.45,1.25 ; -1.25,0.55 -0.55,1.25 ; -1.25,0.65 -0.65,1.25 ; -1.25,0.75 -0.75,1.25 ; -1.25,0.85 -0.85,1.25 ; -1.25,0.95 -0.95,1.25 ; -1.25,1.05 -1.05,1.25 ; -1.25,1.15 -1.15,1.25 ; -1.25,-1.25 -1.25,1.25 1.25,1.25 1.25,-1.25 -1.25,-1.25
Mechanical 15:
  lines w0.05: -1.5,-1.5 1.5,-1.5 1.5,1.5 -1.5,1.5 -1.5,-1.5
3D body "PERICOM_XUA18.stp": height 0.4, standoff 0, extent -1,-1 1,1

## PERICOM_ZBS20 [mm] "PERICOM TQFN Code ZBS20, 0.50mm Pitch, Rect.; 20 Pin, 2.50mm L X 4.50mm W X 1.00mm H Body (W/Thermal Tab 1.2mm X 3.2mm)"
height 1
pads (21):
  rect 0.23x0.23 smd: 1(-0.25,2.1) 2(-1.1,1.75) 3(-1.1,1.25) 4(-1.1,0.75) 5(-1.1,0.25) 6(-1.1,-0.25) 7(-1.1,-0.75) 8(-1.1,-1.25) 9(-1.1,-1.75) 10(-0.25,-2.1) 11(0.25,-2.1) 12(1.1,-1.75) 13(1.1,-1.25) 14(1.1,-0.75) 15(1.1,-0.25) 16(1.1,0.25) 17(1.1,0.75) 18(1.1,1.25) 19(1.1,1.75) 20(0.25,2.1)
  rect 1x2.65 smd: 21(0,0)
Top Overlay:
  circle w0.25: c-0.275,2.85 r0.125
  lines w0.2: -1.25,-2.165 -1.25,-2.25 -0.665,-2.25 ; -1.25,2.165 -1.25,2.25 -0.665,2.25 ; 0.665,-2.25 1.25,-2.25 1.25,-2.165 ; 0.665,2.25 1.25,2.25 1.25,2.165
Mechanical 8:
  lines w0.1: -0.5,0 0,0 ; 0,-0.5 0,0 ; 0,0.5 0,0 ; 0.5,0 0,0 ; -1.215,-1.865 -0.985,-1.865 -0.985,-1.635 -1.215,-1.635 ; -1.215,-1.865 -1.215,-1.635 ; -1.215,-1.865 -1.1,-1.75 -1.215,-1.635 ; -1.215,-1.365 -0.985,-1.365 -0.985,-1.135 -1.215,-1.135 ; -1.215,-1.365 -1.215,-1.135 ; -1.215,-1.365 -1.1,-1.25 -1.215,-1.135 ; -1.215,-0.865 -0.985,-0.865 -0.985,-0.635 -1.215,-0.635 ; -1.215,-0.865 -1.215,-0.635 ; -1.215,-0.865 -1.1,-0.75 -1.215,-0.635 ; -1.215,-0.365 -0.985,-0.365 -0.985,-0.135 -1.215,-0.135 ; -1.215,-0.365 -1.215,-0.135 ; -1.215,-0.365 -1.1,-0.25 -1.215,-0.135 ; -1.215,0.135 -0.985,0.135 -0.985,0.365 -1.215,0.365 ; -1.215,0.135 -1.215,0.365 ; -1.215,0.135 -1.1,0.25 -1.215,0.365 ; -1.215,0.635 -0.985,0.635 -0.985,0.865 -1.215,0.865 ; -1.215,0.635 -1.215,0.865 ; -1.215,0.635 -1.1,0.75 -1.215,0.865 ; -1.215,1.135 -0.985,1.135 -0.985,1.365 -1.215,1.365 ; -1.215,1.135 -1.215,1.365 ; -1.215,1.135 -1.1,1.25 -1.215,1.365 ; -1.215,1.635 -0.985,1.635 -0.985,1.865 -1.215,1.865 ; -1.215,1.635 -1.215,1.865 ; -1.215,1.635 -1.1,1.75 -1.215,1.865 ; -0.365,-2.215 -0.135,-2.215 ; -0.365,-2.215 -0.365,-1.985 ; -0.365,-2.215 -0.25,-2.1 ; -0.365,-1.985 -0.135,-1.985 ; -0.365,-1.985 -0.25,-2.1 ; -0.365,2.215 -0.135,2.215 ; -0.365,2.215 -0.365,1.985 -0.135,1.985 -0.135,2.215 ; -0.365,2.215 -0.25,2.1 -0.135,2.215 ; -0.25,-2.1 -0.135,-1.985 ; -0.25,-2.1 -0.135,-2.215 ; -0.135,-2.215 -0.135,-1.985 ; 0.135,-2.215 0.365,-2.215 ; 0.135,-2.215 0.135,-1.985 ; 0.135,-2.215 0.25,-2.1 ; 0.135,-1.985 0.365,-1.985 ; 0.135,-1.985 0.25,-2.1 ; 0.135,2.215 0.365,2.215 ; 0.135,2.215 0.135,1.985 0.365,1.985 0.365,2.215 ; 0.135,2.215 0.25,2.1 0.365,2.215 ; 0.25,-2.1 0.365,-1.985 ; 0.25,-2.1 0.365,-2.215 ; 0.365,-2.215 0.365,-1.985 ; 1.215,-1.865 1.215,-1.635 ; 1.215,-1.865 0.985,-1.865 0.985,-1.635 1.215,-1.635 ; 1.215,-1.865 1.1,-1.75 1.215,-1.635 ; 1.215,-1.365 1.215,-1.135 ; 1.215,-1.365 0.985,-1.365 0.985,-1.135 1.215,-1.135 ; 1.215,-1.365 1.1,-1.25 1.215,-1.135 ; 1.215,-0.865 1.215,-0.635 ; 1.215,-0.865 0.985,-0.865 0.985,-0.635 1.215,-0.635 ; 1.215,-0.865 1.1,-0.75 1.215,-0.635 ; 1.215,-0.365 1.215,-0.135 ; 1.215,-0.365 0.985,-0.365 0.985,-0.135 1.215,-0.135 ; 1.215,-0.365 1.1,-0.25 1.215,-0.135 ; 1.215,0.135 1.215,0.365 ; 1.215,0.135 0.985,0.135 0.985,0.365 1.215,0.365 ; 1.215,0.135 1.1,0.25 1.215,0.365 ; 1.215,0.635 1.215,0.865 ; 1.215,0.635 0.985,0.635 0.985,0.865 1.215,0.865 ; 1.215,0.635 1.1,0.75 1.215,0.865 ; 1.215,1.135 1.215,1.365 ; 1.215,1.135 0.985,1.135 0.985,1.365 1.215,1.365 ; 1.215,1.135 1.1,1.25 1.215,1.365 ; 1.215,1.635 1.215,1.865 ; 1.215,1.635 0.985,1.635 0.985,1.865 1.215,1.865 ; 1.215,1.635 1.1,1.75 1.215,1.865 ; -0.5,-1.325 0.5,-1.325 0.5,1.325 -0.5,1.325 -0.5,-1.325
Mechanical 14:
  lines w0.1: -1.25,1.25 -0.25,2.25 ; -1.25,1.35 -0.35,2.25 ; -1.25,1.45 -0.45,2.25 ; -1.25,1.55 -0.55,2.25 ; -1.25,1.65 -0.65,2.25 ; -1.25,1.75 -0.75,2.25 ; -1.25,1.85 -0.85,2.25 ; -1.25,1.95 -0.95,2.25 ; -1.25,2.05 -1.05,2.25 ; -1.25,2.15 -1.15,2.25 ; -1.25,-2.25 1.25,-2.25 1.25,2.25 -1.25,2.25 -1.25,-2.25
Mechanical 15:
  lines w0.05: -1.5,-2.5 1.5,-2.5 1.5,2.5 -1.5,2.5 -1.5,-2.5
3D body "PERICOM_ZBS20.stp": height 1, standoff 0, extent -1.25,-2.25 1.25,2.25

## PICOR_QPI-5 LGA [mil] "LGA, 2.54mm pitch, Square; 16 pin, 25.3mm X 25.3mm X 4.98mm H"
height 196.06
pads (16):
  rect 39.37x39.37 smd: 1(-441,300) 5(-300,-441) 6(-100,-441)
  rect 85.98x129.02 smd: 2(-441,100) 3(-441,-100) 4(-441,-300) 9(441,-300) 10(441,-100) 11(441,100) 12(441,300)
  rect 129.02x85.98 smd: 7(100,-441) 8(300,-441) 13(300,441) 14(100,441) 15(-100,441) 16(-300,441)
Top Layer:
  region: -399,364.5 -335,300 -399,235.5 -484,235.5 -484,364.5
  region: -164.5,-484 -35.5,-484 -35.5,-441 -35.5,-436.76 -37.15,-428.46 -40.39,-420.63 -45.1,-413.59 -51.09,-407.6 -58.13,-402.89 -65.96,-399.65 -74.26,-398 -78.5,-398 -121.5,-398 -125.73,-398 -134.04,-399.65 -141.87,-402.89 -148.91,-407.6 -154.9,-413.59 -159.6,-420.63 -162.85,-428.46 -164.5,-436.76 -164.5,-441
  region: -364.5,-484 -235.5,-484 -235.5,-441 -235.5,-436.76 -237.15,-428.46 -240.39,-420.63 -245.1,-413.59 -251.09,-407.6 -258.13,-402.89 -265.96,-399.65 -274.26,-398 -278.5,-398 -321.5,-398 -325.73,-398 -334.04,-399.65 -341.87,-402.89 -348.91,-407.6 -354.9,-413.59 -359.6,-420.63 -362.85,-428.46 -364.5,-436.76 -364.5,-441
Top Overlay:
  circle w19.68: c-531.5,303.15 r9.84
  lines w3.94: -458.63,-498 -458.63,-380.25 ; -458.63,-219.75 -458.63,-180.25 ; -458.63,-19.75 -458.63,19.75 ; -458.63,180.25 -458.63,219.75 ; -458.63,380.25 -458.63,498 ; -498,-498 -498,498 498,498 498,-498 -498,-498
Mechanical 8:
  lines w3.94: -460.68,-300 -441,-300 ; -460.68,-100 -441,-100 ; -460.68,100 -441,100 ; -460.68,300 -441,300 ; -441,-319.69 -441,-300 ; -441,-280.32 -441,-300 ; -441,-119.69 -441,-100 ; -441,-80.31 -441,-100 ; -441,80.31 -441,100 ; -441,119.69 -441,100 ; -441,280.32 -441,300 ; -441,319.69 -441,300 ; -421.31,-300 -441,-300 ; -421.31,-100 -441,-100 ; -421.31,100 -441,100 ; -421.31,300 -441,300 ; -319.68,-441 -300,-441 ; -319.68,441 -300,441 ; -300,-460.69 -300,-441 ; -300,-421.32 -300,-441 ; -300,421.32 -300,441 ; -300,460.69 -300,441 ; -280.31,-441 -300,-441 ; -280.31,441 -300,441 ; -119.68,-441 -100,-441 ; -119.68,441 -100,441 ; -100,-460.69 -100,-441 ; -100,-421.32 -100,-441 ; -100,421.32 -100,441 ; -100,460.69 -100,441 ; -80.31,-441 -100,-441 ; -80.31,441 -100,441 ; -19.68,0 0,0 ; 0,-19.68 0,0 ; 0,19.68 0,0 ; 19.69,0 0,0 ; 80.32,-441 100,-441 ; 80.32,441 100,441 ; 100,-460.69 100,-441 ; 100,-421.32 100,-441 ; 100,421.32 100,441 ; 100,460.69 100,441 ; 119.69,-441 100,-441 ; 119.69,441 100,441 ; 280.32,-441 300,-441 ; 280.32,441 300,441 ; 300,-460.69 300,-441 ; 300,-421.32 300,-441 ; 300,421.32 300,441 ; 300,460.69 300,441 ; 319.69,-441 300,-441 ; 319.69,441 300,441 ; 421.32,-300 441,-300 ; 421.32,-100 441,-100 ; 421.32,100 441,100 ; 421.32,300 441,300 ; 441,-319.69 441,-300 ; 441,-280.32 441,-300 ; 441,-119.69 441,-100 ; 441,-80.31 441,-100 ; 441,80.31 441,100 ; 441,119.69 441,100 ; 441,280.32 441,300 ; 441,319.69 441,300 ; 460.69,-300 441,-300 ; 460.69,-100 441,-100 ; 460.69,100 441,100 ; 460.69,300 441,300 ; -484,-364.5 -398,-364.5 -398,-235.5 -484,-235.5 -484,-364.5 ; -484,-164.5 -398,-164.5 -398,-35.5 -484,-35.5 -484,-164.5 ; -484,35.5 -398,35.5 -398,164.5 -484,164.5 -484,35.5 ; -484,235.5 -484,364.5 -399,364.5 -335,300 -399,235.5 -484,235.5 ; -364.5,-484 -364.5,-441 cw(c-321.5,-441) -321.5,-398 -278.5,-398 cw(c-278.5,-441) -235.5,-441 -235.5,-484 -364.5,-484 ; -364.5,398 -364.5,484 -235.5,484 -235.5,398 -364.5,398 ; -164.5,-484 -164.5,-441 cw(c-121.5,-441) -121.5,-398 -78.5,-398 cw(c-78.5,-441) -35.5,-441 -35.5,-484 -164.5,-484 ; -164.5,398 -164.5,484 -35.5,484 -35.5,398 -164.5,398 ; 35.5,-484 35.5,-398 164.5,-398 164.5,-484 35.5,-484 ; 35.5,398 35.5,484 164.5,484 164.5,398 35.5,398 ; 235.5,-484 235.5,-398 364.5,-398 364.5,-484 235.5,-484 ; 235.5,398 235.5,484 364.5,484 364.5,398 235.5,398 ; 398,-364.5 484,-364.5 484,-235.5 398,-235.5 398,-364.5 ; 398,-164.5 484,-164.5 484,-35.5 398,-35.5 398,-164.5 ; 398,35.5 484,35.5 484,164.5 398,164.5 398,35.5 ; 398,235.5 484,235.5 484,364.5 398,364.5 398,235.5
Mechanical 14:
  circle w3.94: c-277.56,303.15 r29.53
  lines w3.94: -458.63,-498 -458.63,498 ; -498,-498 -498,498 498,498 498,-498 -498,-498
Mechanical 15:
  lines w3.94: -507.84,-507.84 -507.84,507.84 507.84,507.84 507.84,-507.84 -507.84,-507.84
3D body "PICOR_QPI-5 LGA.stp": height 196.85, standoff 0, extent -498,-498 498,498